# Altium footprint library 2.52-直插元件.PcbLib: 467 footprints (part 9 of 30)
Each footprint in its own frame and in the unit in brackets; x right, y up, seen from the top. Pads: shape width x height; smd on the part's side, far side on the other; paste and mask are expansions set on the pad; w line width, h text height; cw(c..) or ccw(c..) is an arc to the next point about the centre after c.
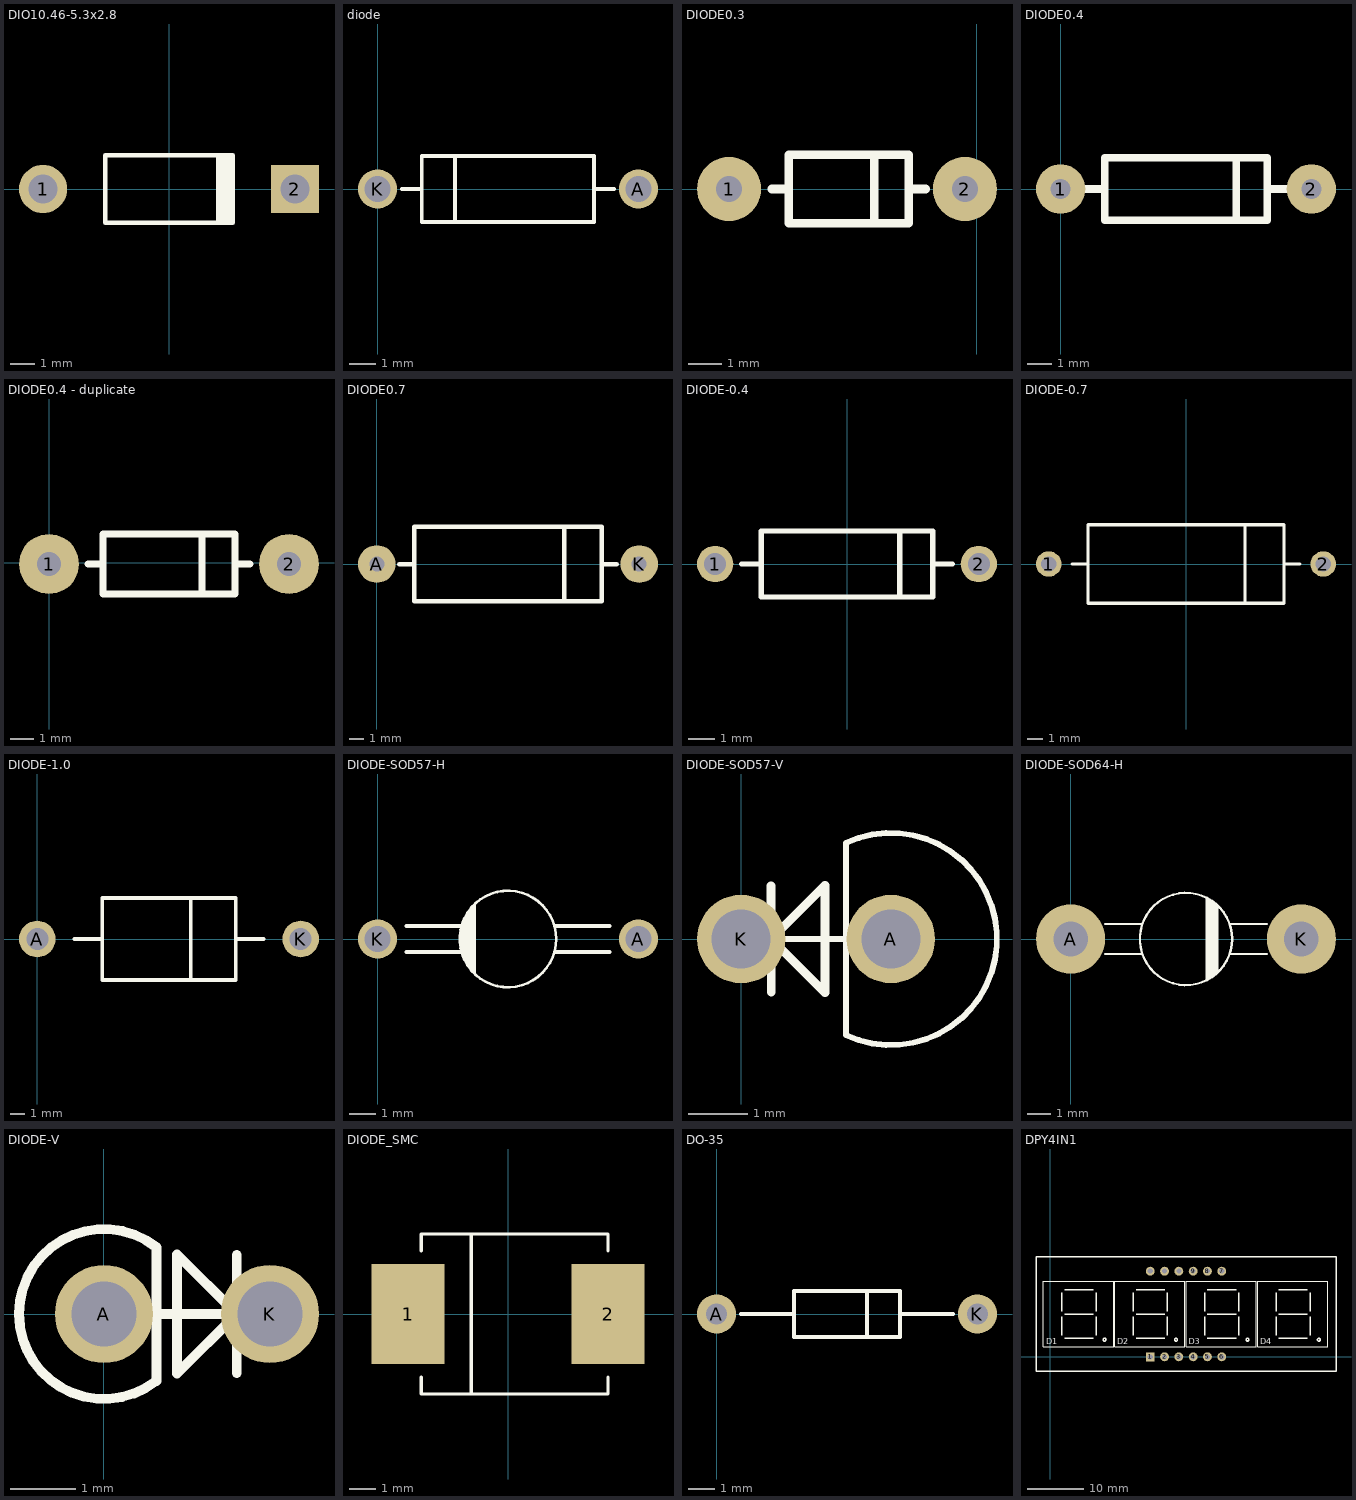
[diagram p8: the footprints below, top view; thin cyan lines are the x and y axes]

## DIO10.46-5.3x2.8 [mm] "Diode, Axial; Body 5.2 x 2.7 mm (LxDia. max), Lead Dia. 0.86 mm (max)"
height 2.8
pads (2):
  round 2 hole 1.2: 1(-5.23,0)
  rect 2x2 hole 1.2: 2(5.23,0)
Top Overlay:
  rectangle: 1.95,-1.4 2.75,1.4
  lines w0.2: 2.65,-1.4 -2.65,-1.4 -2.65,1.4 2.65,1.4

## diode [mm]
pads (2):
  round 1.5 hole 1: A(10,0) K(0,0)
Top Overlay:
  lines w0.15: 0.933,0 1.695,0 ; 2.965,-1.27 2.965,1.27 ; 8.299,0 9.061,0 ; 1.695,-1.27 8.299,-1.27 8.299,1.27 1.695,1.27 1.695,-1.27
3D body "DO-41.step": height 2.86, standoff -2.5, extent -0.427,-1.363 10.433,1.362

## DIODE0.3 [mil]
pads (2):
  round 75 hole 30: 1(-290,0) 2(-14,0)
Top Overlay:
  lines w10: -240,0 -220,0 ; -120,-40 -120,40 ; -80,0 -60,0 ; -220,-40 -80,-40 -80,40 -220,40 -220,-40
3D body "User Library-1n4148-1.STEP": height 89.37, standoff -166.54, extent -299.64,-42 -4.36,36.74

## DIODE0.4 [mm]
pads (2):
  round 2 hole 0.813: 1(0,0) 2(10.16,0)
Top Overlay:
  lines w0.305: 1.016,0 1.778,0 ; 7.112,-1.27 7.112,1.27 ; 8.382,0 9.144,0 ; 1.778,-1.27 8.382,-1.27 8.382,1.27 1.778,1.27 1.778,-1.27
3D body "DO-41.STEP": height 3.3, standoff -2, extent -0.367,-1.249 10.693,1.351

## DIODE0.4 - duplicate [mil]
pads (2):
  round 100 hole 40: 1(0,-2) 2(400,-2)
Top Overlay:
  lines w12: 65,-2 90,-2 ; 255,-52 255,48 ; 310,-2 335,-2 ; 90,-52 90,48 310,48 310,-52 90,-52
3D body "User Library-DO-15-1.STEP": height 132.99, standoff -126.85, extent -16.75,-64.98 414.75,61

## DIODE0.7 [mil]
pads (2):
  round 100 hole 40: A(0,0) K(700,0)
Top Overlay:
  lines w12: 60,0 100,0 ; 500,-100 500,100 ; 600,0 640,0 ; 100,-100 100,100 600,100 600,-100 100,-100

## DIODE-0.4 [mm] "Diode, Thru-Hole; 2 Leads; 0.4 in Pin Spacing"
height 2.54
pads (2):
  round 1.4 hole 0.85: 1(-5.08,0) 2(5.08,0)
Top Overlay:
  lines w0.2: -4.064,0 -3.302,0 ; 2.032,-1.27 2.032,1.27 ; 3.302,0 4.064,0 ; -3.302,-1.27 -3.302,1.27 3.302,1.27 3.302,-1.27 -3.302,-1.27

## DIODE-0.7 [mm] "Diode, Thru-Hole; 2 Leads; 0.7 in Pin Spacing"
height 5.08
pads (2):
  round 1.65 hole 1: 1(-8.89,0) 2(8.89,0)
Top Overlay:
  lines w0.2: -7.366,0 -6.35,0 ; 3.81,-2.54 3.81,2.54 ; 6.35,0 7.366,0 ; -6.35,-2.54 -6.35,2.54 6.35,2.54 6.35,-2.54 -6.35,-2.54

## DIODE-1.0 [mm] "淘宝ID:黄晶宝石   店铺网址:https://shop463601444.taobao.com"
pads (2):
  round 2.5 hole 1.5: A(0,0) K(18,0)
Top Overlay:
  lines w0.254: 2.54,0 4.445,0 ; 10.482,-2.8 10.482,2.8 ; 13.555,0 15.46,0 ; 4.445,0 4.445,2.8 13.555,2.8 13.555,-2.8 4.445,-2.8 4.445,0
3D body "二?": height 7.5, standoff -5, extent -0.65,-2.5 18.65,2.5

## DIODE-SOD57-H [mm]
pads (2):
  round 1.5 hole 1: A(10,0) K(0,0)
Top Overlay:
  circle w0.1: c4.997,0 r1.85
  region: 3.715,1.322 3.678,1.285 3.551,1.158 3.353,0.861 3.216,0.531 3.146,0.18 3.146,0.001 3.146,-0.178 3.216,-0.529 3.353,-0.859 3.551,-1.156 3.678,-1.283 3.715,-1.32
  lines w0.1: 3.715,-1.32 3.715,1.322
  lines w0.15: 1.113,-0.5 3.202,-0.5 ; 1.113,0.5 3.202,0.5 ; 6.798,-0.5 8.887,-0.5 ; 6.798,0.5 8.887,0.5
3D body "User Library-SOD57.STEP": height 3.88, standoff -1.4, extent -0.483,-1.876 10.477,1.876

## DIODE-SOD57-V [mm]
pads (2):
  round 1.5 hole 1: A(2.54,0) K(0,0)
Top Overlay:
  lines w0.1: 0,0 2.54,0 ; 1.779,1.616 1.779,-1.631 ccw(c2.54,0) 1.779,1.631
  lines w0.15: 0.508,0 0.508,0.903 ; 0.509,-0.903 0.509,0 ; 0.509,0 1.421,-0.912 1.421,0.912 0.509,0
3D body "User Library-SOD57(V).STEP": height 7.92, standoff -1.75, extent -0.438,-1.876 4.378,1.876

## DIODE-SOD64-H [mm]
pads (2):
  round 3 hole 1.5: A(0,0) K(10,0)
Top Overlay:
  circle w0.1: c5,0 r2
  lines w0.1: 1.49,0.649 3.1,0.649 ; 1.503,-0.653 3.112,-0.653 ; 5.891,1.77 5.891,-1.779 5.898,-1.786 ; 5.961,-1.723 5.973,-1.711 5.973,1.707 ; 6.055,-1.686 6.061,-1.68 6.061,1.65 ; 6.136,-1.604 6.155,-1.585 6.155,1.594 ; 6.237,-1.541 6.243,-1.535 6.243,1.525 ; 6.294,1.468 6.294,-1.516 6.3,-1.522 ; 6.35,1.456 6.35,-1.447 6.363,-1.46 ; 6.888,-0.653 8.497,-0.653 ; 6.9,0.649 8.51,0.649
3D body "User Library-BYV28-200.STEP": height 4.75, standoff -2.5, extent -0.675,-2.25 10.675,2.25

## DIODE-V [mm]
pads (2):
  round 1.5 hole 1: A(0,0) K(2.54,0)
Top Overlay:
  lines w0.15: 0.797,-1.027 cw(c0,0) 0.805,1.021 0.805,-1.027 ; 0.83,0 2.219,0 ; 2.031,-0.903 2.031,0 ; 2.032,0 2.032,0.903 ; 2.031,0 1.119,-0.912 1.119,0.912 2.031,0
3D body "User Library-1N4007_Stand.step": height 6.59, standoff -1.8, extent -1.273,-1.333 2.995,1.333

## DIODE_SMC [mil] "Magnetic-Core Inductor with Winding Polarity Marking; 2 Leads"
pads (2):
  rect 110x150 smd: 1(-150,0) 2(150,0)
Top Overlay:
  lines w5: -130,-95 -130,-120 150,-120 150,-95 ; -130,95 -130,120 150,120 150,95 ; -55,-120 -55,120
Mechanical 1:
  lines w1: -130,-120 150,-120 ; -130,120 150,120

## DO-35 [mm]
pads (2):
  round 1.5 hole 0.8: A(0,0) K(10,0)
Top Overlay:
  lines w0.15: 0.939,0 2.971,0.003 ; 5.765,-0.889 5.765,0.889 ; 7.03,-0.889 2.971,-0.889 2.971,0.889 7.03,0.889 ; 7.035,-0.889 7.035,0.889 ; 7.035,-0.001 9.067,0
3D body "User Library-do_35.step": height 1.75, standoff -2.94, extent -0.35,-0.876 10.342,0.876

## DPY4IN1 [mil]
pads (12):
  rect 62x62 hole 36: 1(700,0)
  round 62 hole 36: 2(800,0) 3(900,0) 4(1000,0) 5(1100,0) 6(1200,0) 7(1200,600) 8(1100,600) 9(1000,600) 10(900,600) 11(800,600) 12(700,600)
Top Overlay:
  circle w10: c1880,120 r10
  circle w10: c1380,120 r10
  circle w10: c880,120 r10
  circle w10: c380,120 r10
  lines w7.87: -49.21,70.28 442.91,70.28 442.91,528.15 -49.21,528.15 -49.21,323.82 -49.21,70.28 ; 450.79,70.28 942.91,70.28 942.91,528.15 450.79,528.15 450.79,323.82 450.79,70.28 ; 950.79,70.28 1442.91,70.28 1442.91,528.15 950.79,528.15 950.79,323.82 950.79,70.28 ; 1450.79,70.28 1942.91,70.28 1942.91,528.15 1450.79,528.15 1450.79,323.82 1450.79,70.28
  lines w10: 80,150 80,280 ; 80,320 80,450 ; 100,130 300,130 ; 100,300 300,300 ; 100,470 300,470 ; 320,150 320,280 ; 320,320 320,450 ; 580,150 580,280 ; 580,320 580,450 ; 600,130 800,130 ; 600,300 800,300 ; 600,470 800,470 ; 820,150 820,280 ; 820,320 820,450 ; 1080,150 1080,280 ; 1080,320 1080,450 ; 1100,130 1300,130 ; 1100,300 1300,300 ; 1100,470 1300,470 ; 1320,150 1320,280 ; 1320,320 1320,450 ; 1580,150 1580,280 ; 1580,320 1580,450 ; 1600,130 1800,130 ; 1600,300 1800,300 ; 1600,470 1800,470 ; 1820,150 1820,280 ; 1820,320 1820,450 ; -100,-100 -100,700 2000,700 2000,-100 -100,-100
  text "D4" at 1470,90 h40
  text "D3" at 970,90 h40
  text "D2" at 470,90 h40
  text "D1" at -30,90 h40